# Altium integrated library WE-WPCC_rev16a.intlib: 38 symbols
Pins are listed as number, name and electrical type; pins without a type are passive.

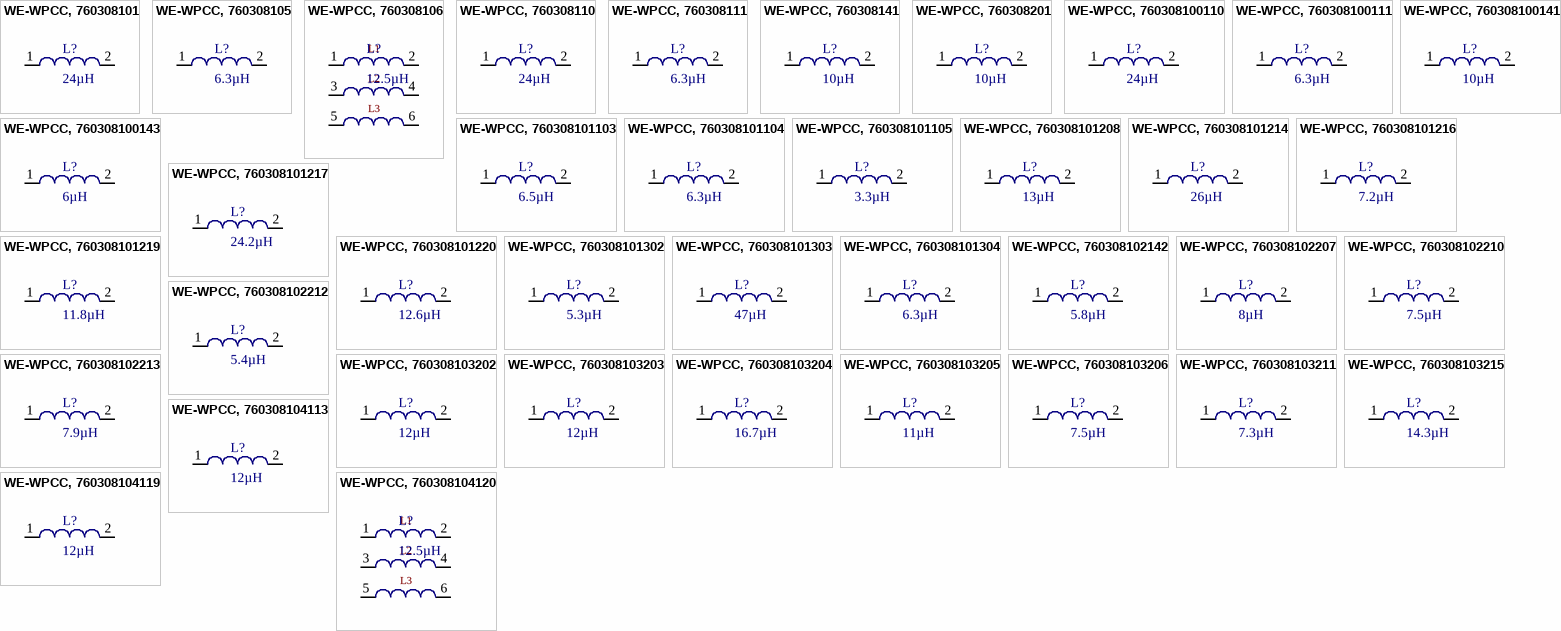
[diagram p0: symbols WE-WPCC, 760308101 to WE-WPCC, 760308104120]

## WE-WPCC, 760308101
designator L?, comment 24µH
WE-WPCC Wireless Power Charging Transmitter Coil, 4832, L= 24µH; partNo: 760308101; Manufacturer: Wurth Elektronik; Inductance: 24µH; ComponentLink1Description: Manufacturer; ComponentLink1URL: http://www.we-online.de; Created by: Baojun Chen; Created Date: Jan.2016; ComponentLink2Description: Datasheet; ComponentLink2URL: http://katalog.we-online.de/pbs/datasheet/760308101.pdf
footprint 760308101 (WE-WPCC Wireless Power Charging Receiver Coil, 5353)
pins: 1, 2

## WE-WPCC, 760308105
designator L?, comment 6.3µH
WE-WPCC Wireless Power Charging Transmitter Coil, 5353, L= 6.3µH; partNo: 760308105; Manufacturer: Wurth Elektronik; Inductance: 6.3µH; ComponentLink1Description: Manufacturer; ComponentLink1URL: http://www.we-online.de; Created by: Baojun Chen; Created Date: Jan.2016; ComponentLink2Description: Datasheet; ComponentLink2URL: http://katalog.we-online.de/pbs/datasheet/760308105.pdf
footprint 760308105 (WE-WPCC Wireless Power Charging Transmitter Coil, 5353)
pins: 1, 2

## WE-WPCC, 760308106
designator L?, comment 12.5µH
WE-WPCC Wireless Power Array, 13055, L= 12.5µH; partNo: 760308106; Manufacturer: Wurth Elektronik; Inductance: 12.5µH; ComponentLink1Description: Manufacturer; ComponentLink1URL: http://www.we-online.de; Created by: Baojun Chen; Created Date: Jan.2016; ComponentLink2Description: Datasheet; ComponentLink2URL: http://katalog.we-online.de/pbs/datasheet/760308106.pdf
footprint 760308106 (WE-WPCC Wireless Power Array, 13055)
pins: 1, 2, 3, 4, 5, 6
text: L1; L2; L3

## WE-WPCC, 760308110
designator L?, comment 24µH
WE-WPCC Wireless Power Charging Transmitter Coil, 5353, L= 24µH; partNo: 760308110; Manufacturer: Wurth Elektronik; Inductance: 24µH; ComponentLink1Description: Manufacturer; ComponentLink1URL: http://www.we-online.de; Created by: Baojun Chen; Created Date: Jan.2016; ComponentLink2Description: Datasheet; ComponentLink2URL: http://katalog.we-online.de/pbs/datasheet/760308110.pdf
footprint 760308110 (WE-WPCC Wireless Power Charging Transmitter Coil, 5353)
pins: 1, 2

## WE-WPCC, 760308111
designator L?, comment 6.3µH
WE-WPCC Wireless Power Charging Transmitter Coil, 5353, L= 6.3µH; partNo: 760308111; Manufacturer: Wurth Elektronik; Inductance: 6.3µH; ComponentLink1Description: Manufacturer; ComponentLink1URL: http://www.we-online.de; Created by: Baojun Chen; Created Date: Jan.2016; ComponentLink2Description: Datasheet; ComponentLink2URL: http://katalog.we-online.de/pbs/datasheet/760308111.pdf
footprint 760308111 (WE-WPCC Wireless Power Charging Transmitter Coil, 5353)
pins: 1, 2

## WE-WPCC, 760308141
designator L?, comment 10µH
WE-WPCC Wireless Power Charging Transmitter Coil, 5353, L= 10µH; partNo: 760308141; Manufacturer: Wurth Elektronik; Inductance: 10µH; ComponentLink1Description: Manufacturer; ComponentLink1URL: http://www.we-online.de; Created by: Baojun Chen; Created Date: Jan.2016; ComponentLink2Description: Datasheet; ComponentLink2URL: http://katalog.we-online.de/pbs/datasheet/760308141.pdf
footprint 760308141 (WE-WPCC Wireless Power Charging Transmitter Coil, 5353)
pins: 1, 2

## WE-WPCC, 760308201
designator L?, comment 10µH
WE-WPCC Wireless Power Charging Receiver Coil, 3737, L= 10µH; partNo: 760308201; Manufacturer: Wurth Elektronik; Inductance: 10µH; ComponentLink1Description: Manufacturer; ComponentLink1URL: http://www.we-online.de; Created by: Baojun Chen; Created Date: Jan.2016; ComponentLink2Description: Datasheet; ComponentLink2URL: http://katalog.we-online.de/pbs/datasheet/760308201.pdf
footprint 760308201 (WE-WPCC Wireless Power Charging Receiver Coil, 3737)
pins: 1, 2

## WE-WPCC, 760308100110
designator L?, comment 24µH
WE-WPCC Wireless Power Charging Transmitter Coil, L= 24µH; partNo: 760308100110; Manufacturer: Wurth Elektronik; Inductance: 24µH; ComponentLink1Description: Manufacturer; ComponentLink1URL: http://www.we-online.de; Created by: Baojun Chen; Created Date: Jan.2016; ComponentLink2Description: Datasheet; ComponentLink2URL: http://katalog.we-online.de/pbs/datasheet/760308100110.pdf
footprint 760308100110 (WE-WPCC Wireless Power Charging Transmitter Coil, ? 50)
pins: 1, 2

## WE-WPCC, 760308100111
designator L?, comment 6.3µH
WE-WPCC Wireless Power Charging Transmitter Coil, L= 6.3µH; partNo: 760308100111; Manufacturer: Wurth Elektronik; Inductance: 6.3µH; ComponentLink1Description: Manufacturer; ComponentLink1URL: http://www.we-online.de; Created by: Baojun Chen; Created Date: Jan.2016; ComponentLink2Description: Datasheet; ComponentLink2URL: http://katalog.we-online.de/pbs/datasheet/760308100111.pdf
footprint 760308100111 (WE-WPCC Wireless Power Charging Transmitter Coil, ? 50)
pins: 1, 2

## WE-WPCC, 760308100141
designator L?, comment 10µH
WE-WPCC Wireless Power Charging Transmitter Coil, L= 10µH; partNo: 760308100141; Manufacturer: Wurth Elektronik; Inductance: 10µH; ComponentLink1Description: Manufacturer; ComponentLink1URL: http://www.we-online.de; Created by: Baojun Chen; Created Date: Jan.2016; ComponentLink2Description: Datasheet; ComponentLink2URL: http://katalog.we-online.de/pbs/datasheet/760308100141.pdf
footprint 760308100141 (WE-WPCC Wireless Power Charging Transmitter Coil, ? 50)
pins: 1, 2

## WE-WPCC, 760308100143
designator L?, comment 6µH
WE-WPCC Wireless Power Charging Transmitter Coil, L= 6µH; partNo: 760308100143; Manufacturer: Wurth Elektronik; Inductance: 6µH; ComponentLink1Description: Manufacturer; ComponentLink1URL: http://www.we-online.de; Created by: Baojun Chen; Created Date: Jan.2016; ComponentLink2Description: Datasheet; ComponentLink2URL: http://katalog.we-online.de/pbs/datasheet/760308100143.pdf
footprint 760308100143 (WE-WPCC Wireless Power Charging Transmitter Coil, ? 50)
pins: 1, 2

## WE-WPCC, 760308101103
designator L?, comment 6.5µH
WE-WPCC Wireless Power Charging Transmitter Coil, L= 6.5µH; partNo: 760308101103; Manufacturer: Wurth Elektronik; Inductance: 6.5µH; ComponentLink1Description: Manufacturer; ComponentLink1URL: http://www.we-online.de; Created by: Baojun Chen; Created Date: Jan.2016; ComponentLink2Description: Datasheet; ComponentLink2URL: http://katalog.we-online.de/pbs/datasheet/760308101103.pdf
footprint 760308101103 (WE-WPCC Wireless Power Charging Transmitter Coil, ? 30)
pins: 1, 2

## WE-WPCC, 760308101104
designator L?, comment 6.3µH
WE-WPCC Wireless Power Charging Transmitter Coil, L= 6.3µH; partNo: 760308101104; Manufacturer: Wurth Elektronik; Inductance: 6.3µH; ComponentLink1Description: Manufacturer; ComponentLink1URL: http://www.we-online.de; Created by: Baojun Chen; Created Date: Jan.2016; ComponentLink2Description: Datasheet; ComponentLink2URL: http://katalog.we-online.de/pbs/datasheet/760308101104.pdf
footprint 760308101104 (WE-WPCC Wireless Power Charging Transmitter Coil, ? 20)
pins: 1, 2

## WE-WPCC, 760308101105
designator L?, comment 3.3µH
WE-WPCC Wireless Power Charging Transmitter Coil, L= 3.3µH; partNo: 760308101105; Manufacturer: Wurth Elektronik; Inductance: 3.3µH; ComponentLink1Description: Manufacturer; ComponentLink1URL: http://www.we-online.de; Created by: Baojun Chen; Created Date: Jan.2016; ComponentLink2Description: Datasheet; ComponentLink2URL: http://katalog.we-online.de/pbs/datasheet/760308101105.pdf
footprint 760308101105 (WE-WPCC Wireless Power Charging Transmitter Coil, ? 20)
pins: 1, 2

## WE-WPCC, 760308101208
designator L?, comment 13µH
WE-WPCC Wireless Power Charging Receiver Coil, L= 13µH; partNo: 760308101208; Manufacturer: Wurth Elektronik; Inductance: 13µH; ComponentLink1Description: Manufacturer; ComponentLink1URL: http://www.we-online.de; Created by: Baojun Chen; Created Date: Jan.2016; ComponentLink2Description: Datasheet; ComponentLink2URL: http://katalog.we-online.de/pbs/datasheet/760308101208.pdf
footprint 760308101208 (WE-WPCC Wireless Power Charging Receiver Coil, ? 10)
pins: 1, 2

## WE-WPCC, 760308101214
designator L?, comment 26µH
WE-WPCC Wireless Power Charging Receiver Coil, L= 26µH; partNo: 760308101214; Manufacturer: Wurth Elektronik; Inductance: 26µH; ComponentLink1Description: Manufacturer; ComponentLink1URL: http://www.we-online.de; Created by: Baojun Chen; Created Date: Jan.2016; ComponentLink2Description: Datasheet; ComponentLink2URL: http://katalog.we-online.de/pbs/datasheet/760308101214.pdf
footprint 760308101214 (WE-WPCC Wireless Power Charging Receiver Coil, ? 19)
pins: 1, 2

## WE-WPCC, 760308101216
designator L?, comment 7.2µH
WE-WPCC Wireless Power Charging Receiver Coil, L= 7.2µH; partNo: 760308101216; Manufacturer: Wurth Elektronik; Inductance: 7.2µH; ComponentLink1Description: Manufacturer; ComponentLink1URL: http://www.we-online.de; Created by: Baojun Chen; Created Date: Jan.2016; ComponentLink2Description: Datasheet; ComponentLink2URL: http://katalog.we-online.de/pbs/datasheet/760308101216.pdf
footprint 760308101216 (WE-WPCC Wireless Power Charging Receiver Coil, ? 6)
pins: 1, 2

## WE-WPCC, 760308101217
designator L?, comment 24.2µH
WE-WPCC Wireless Power Charging Receiver Coil, L= 24.2µH; partNo: 760308101217; Manufacturer: Wurth Elektronik; Inductance: 24.2µH; ComponentLink1Description: Manufacturer; ComponentLink1URL: http://www.we-online.de; Created by: Baojun Chen; Created Date: Jan.2016; ComponentLink2Description: Datasheet; ComponentLink2URL: http://katalog.we-online.de/pbs/datasheet/760308101217.pdf
footprint 760308101217 (WE-WPCC Wireless Power Charging Receiver Coil, ? 10)
pins: 1, 2

## WE-WPCC, 760308101219
designator L?, comment 11.8µH
WE-WPCC Wireless Power Charging Receiver Coil, L= 11.8µH; partNo: 760308101219; Manufacturer: Wurth Elektronik; Inductance: 11.8µH; ComponentLink1Description: Manufacturer; ComponentLink1URL: http://www.we-online.de; Created by: Baojun Chen; Created Date: Jan.2016; ComponentLink2Description: Datasheet; ComponentLink2URL: http://katalog.we-online.de/pbs/datasheet/760308101219.pdf
footprint 760308101219 (WE-WPCC Wireless Power Charging Receiver Coil, ? 15)
pins: 1, 2

## WE-WPCC, 760308101220
designator L?, comment 12.6µH
WE-WPCC Wireless Power Charging Receiver Coil, L= 12.6µH; partNo: 760308101220; Manufacturer: Wurth Elektronik; Inductance: 12.6µH; ComponentLink1Description: Manufacturer; ComponentLink1URL: http://www.we-online.de; Created by: Baojun Chen; Created Date: Jan.2016; ComponentLink2Description: Datasheet; ComponentLink2URL: http://katalog.we-online.de/pbs/datasheet/760308101220.pdf
footprint 760308101220 (WE-WPCC Wireless Power Charging Receiver Coil, ? 17)
pins: 1, 2

## WE-WPCC, 760308101302
designator L?, comment 5.3µH
WE-WPCC Wireless Power Charging Transmitter Coil, L= 5.3µH; partNo: 760308101302; Manufacturer: Wurth Elektronik; Inductance: 5.3µH; ComponentLink1Description: Manufacturer; ComponentLink1URL: http://www.we-online.de; Created by: Baojun Chen; Created Date: Jan.2016; ComponentLink2Description: Datasheet; ComponentLink2URL: http://katalog.we-online.de/pbs/datasheet/760308101302.pdf
footprint 760308101302 (WE-WPCC Wireless Power Charging Transmitter Coil, ? 50)
pins: 1, 2

## WE-WPCC, 760308101303
designator L?, comment 47µH
WE-WPCC Wireless Power Charging Receiver Coil, L= 47µH; partNo: 760308101303; Manufacturer: Wurth Elektronik; Inductance: 47µH; ComponentLink1Description: Manufacturer; ComponentLink1URL: http://www.we-online.de; Created by: Baojun Chen; Created Date: Jan.2016; ComponentLink2Description: Datasheet; ComponentLink2URL: http://katalog.we-online.de/pbs/datasheet/760308101303.pdf
footprint 760308101303 (WE-WPCC Wireless Power Charging Receiver Coil, ? 26)
pins: 1, 2

## WE-WPCC, 760308101304
designator L?, comment 6.3µH
WE-WPCC Wireless Power Charging Transmitter Coil, L= 6.3µH; partNo: 760308101304; Manufacturer: Wurth Elektronik; Inductance: 6.3µH; ComponentLink1Description: Manufacturer; ComponentLink1URL: http://www.we-online.de; Created by: Baojun Chen; Created Date: Jan.2016; ComponentLink2Description: Datasheet; ComponentLink2URL: http://katalog.we-online.de/pbs/datasheet/760308101304.pdf
footprint 760308101304 (WE-WPCC Wireless Power Charging Transmitter Coil, ? 48)
pins: 1, 2

## WE-WPCC, 760308102142
designator L?, comment 5.8µH
WE-WPCC Wireless Power Charging Transmitter Coil, 5353, L= 5.8µH; partNo: 760308102142; Manufacturer: Wurth Elektronik; Inductance: 5.8µH; ComponentLink1Description: Manufacturer; ComponentLink1URL: http://www.we-online.de; Created by: Baojun Chen; Created Date: Jan.2016; ComponentLink2Description: Datasheet; ComponentLink2URL: http://katalog.we-online.de/pbs/datasheet/760308102142.pdf
footprint 760308102142 (WE-WPCC Wireless Power Charging Transmitter Coil, 5353)
pins: 1, 2

## WE-WPCC, 760308102207
designator L?, comment 8µH
WE-WPCC Wireless Power Charging Receiver Coil, 4040, L= 8µH; partNo: 760308102207; Manufacturer: Wurth Elektronik; Inductance: 8µH; ComponentLink1Description: Manufacturer; ComponentLink1URL: http://www.we-online.de; Created by: Baojun Chen; Created Date: Jan.2016; ComponentLink2Description: Datasheet; ComponentLink2URL: http://katalog.we-online.de/pbs/datasheet/760308102207.pdf
footprint 760308102207 (WE-WPCC Wireless Power Charging Receiver Coil, 4040)
pins: 1, 2

## WE-WPCC, 760308102210
designator L?, comment 7.5µH
WE-WPCC Wireless Power Charging Receiver Coil, 2929, L= 7.5µH; partNo: 760308102210; Manufacturer: Wurth Elektronik; Inductance: 7.5µH; ComponentLink1Description: Manufacturer; ComponentLink1URL: http://www.we-online.de; Created by: Baojun Chen; Created Date: Jan.2016; ComponentLink2Description: Datasheet; ComponentLink2URL: http://katalog.we-online.de/pbs/datasheet/760308102210.pdf
footprint 760308102210 (WE-WPCC Wireless Power Charging Receiver Coil, 3737)
pins: 1, 2

## WE-WPCC, 760308102212
designator L?, comment 5.4µH
WE-WPCC Wireless Power Charging Receiver Coil, 2929, L= 5.4µH; partNo: 760308102212; Manufacturer: Wurth Elektronik; Inductance: 5.4µH; ComponentLink1Description: Manufacturer; ComponentLink1URL: http://www.we-online.de; Created by: Baojun Chen; Created Date: Jan.2016; ComponentLink2Description: Datasheet; ComponentLink2URL: http://katalog.we-online.de/pbs/datasheet/760308102212.pdf
footprint 760308102212 (WE-WPCC Wireless Power Charging Receiver Coil, 2929)
pins: 1, 2

## WE-WPCC, 760308102213
designator L?, comment 7.9µH
WE-WPCC Wireless Power Charging Receiver Coil, 2929, L= 7.9µH; partNo: 760308102213; Manufacturer: Wurth Elektronik; Inductance: 7.9µH; ComponentLink1Description: Manufacturer; ComponentLink1URL: http://www.we-online.de; Created by: Baojun Chen; Created Date: Jan.2016; ComponentLink2Description: Datasheet; ComponentLink2URL: http://katalog.we-online.de/pbs/datasheet/760308102213.pdf
footprint 760308102213 (WE-WPCC Wireless Power Charging Receiver Coil, 2929)
pins: 1, 2

## WE-WPCC, 760308103202
designator L?, comment 12µH
WE-WPCC Wireless Power Charging Receiver Coil, 4832, L= 12µH; partNo: 760308103202; Manufacturer: Wurth Elektronik; Inductance: 12µH; ComponentLink1Description: Manufacturer; ComponentLink1URL: http://www.we-online.de; Created by: Baojun Chen; Created Date: Jan.2016; ComponentLink2Description: Datasheet; ComponentLink2URL: http://katalog.we-online.de/pbs/datasheet/760308103202.pdf
footprint 760308103202 (WE-WPCC Wireless Power Charging Receiver Coil, 4832)
pins: 1, 2

## WE-WPCC, 760308103203
designator L?, comment 12µH
WE-WPCC Wireless Power Charging Receiver Coil, 4832, L= 12µH; partNo: 760308103203; Manufacturer: Wurth Elektronik; Inductance: 12µH; ComponentLink1Description: Manufacturer; ComponentLink1URL: http://www.we-online.de; Created by: Baojun Chen; Created Date: Jan.2016; ComponentLink2Description: Datasheet; ComponentLink2URL: http://katalog.we-online.de/pbs/datasheet/760308103203.pdf
footprint 760308103203 (WE-WPCC Wireless Power Charging Receiver Coil, 4832)
pins: 1, 2

## WE-WPCC, 760308103204
designator L?, comment 16.7µH
WE-WPCC Wireless Power Charging Receiver Coil, 3830, L= 16.7µH; partNo: 760308103204; Manufacturer: Wurth Elektronik; Inductance: 16.7µH; ComponentLink1Description: Manufacturer; ComponentLink1URL: http://www.we-online.de; Created by: Baojun Chen; Created Date: Jan.2016; ComponentLink2Description: Datasheet; ComponentLink2URL: http://katalog.we-online.de/pbs/datasheet/760308103204.pdf
footprint 760308103204 (WE-WPCC Wireless Power Charging Receiver Coil, 3830)
pins: 1, 2

## WE-WPCC, 760308103205
designator L?, comment 11µH
WE-WPCC Wireless Power Charging Receiver Coil, 3426, L= 11µH; partNo: 760308103205; Manufacturer: Wurth Elektronik; Inductance: 11µH; ComponentLink1Description: Manufacturer; ComponentLink1URL: http://www.we-online.de; Created by: Baojun Chen; Created Date: Jan.2016; ComponentLink2Description: Datasheet; ComponentLink2URL: http://katalog.we-online.de/pbs/datasheet/760308103205.pdf
footprint 760308103205 (WE-WPCC Wireless Power Charging Receiver Coil, 3426)
pins: 1, 2

## WE-WPCC, 760308103206
designator L?, comment 7.5µH
WE-WPCC Wireless Power Charging Receiver Coil, 2815, L= 7.5µH; partNo: 760308103206; Manufacturer: Wurth Elektronik; Inductance: 7.5µH; ComponentLink1Description: Manufacturer; ComponentLink1URL: http://www.we-online.de; Created by: Baojun Chen; Created Date: Jan.2016; ComponentLink2Description: Datasheet; ComponentLink2URL: http://katalog.we-online.de/pbs/datasheet/760308103206.pdf
footprint 760308103206 (WE-WPCC Wireless Power Charging Receiver Coil, 2815)
pins: 1, 2

## WE-WPCC, 760308103211
designator L?, comment 7.3µH
WE-WPCC Wireless Power Charging Receiver Coil, 4636, L= 7.3µH; partNo: 760308103211; Manufacturer: Wurth Elektronik; Inductance: 7.3µH; ComponentLink1Description: Manufacturer; ComponentLink1URL: http://www.we-online.de; Created by: Baojun Chen; Created Date: Jan.2016; ComponentLink2Description: Datasheet; ComponentLink2URL: http://katalog.we-online.de/pbs/datasheet/760308103211.pdf
footprint 760308103211 (WE-WPCC Wireless Power Charging Receiver Coil, 4636)
pins: 1, 2

## WE-WPCC, 760308103215
designator L?, comment 14.3µH
WE-WPCC Wireless Power Charging Receiver Coil, 4832, L= 14.3µH; partNo: 760308103215; Manufacturer: Wurth Elektronik; Inductance: 14.3µH; ComponentLink1Description: Manufacturer; ComponentLink1URL: http://www.we-online.de; Created by: Baojun Chen; Created Date: Jan.2016; ComponentLink2Description: Datasheet; ComponentLink2URL: http://katalog.we-online.de/pbs/datasheet/760308103215.pdf
footprint 760308103215 (WE-WPCC Wireless Power Charging Receiver Coil, 4832)
pins: 1, 2

## WE-WPCC, 760308104113
designator L?, comment 12µH
WE-WPCC Wireless Power Charging Transmitter Coil, 6052, L= 12µH; partNo: 760308104113; Manufacturer: Wurth Elektronik; Inductance: 12µH; ComponentLink1Description: Manufacturer; ComponentLink1URL: http://www.we-online.de; Created by: Baojun Chen; Created Date: Jan.2016; ComponentLink2Description: Datasheet; ComponentLink2URL: http://katalog.we-online.de/pbs/datasheet/760308104113.pdf
footprint 760308104113 (WE-WPCC Wireless Power Charging Transmitter Coil, 6052)
pins: 1, 2

## WE-WPCC, 760308104119
designator L?, comment 12µH
WE-WPCC Wireless Power Array, 8852, L= 12µH; partNo: 760308104119; Manufacturer: Wurth Elektronik; Inductance: 12µH; ComponentLink1Description: Manufacturer; ComponentLink1URL: http://www.we-online.de; Created by: Baojun Chen; Created Date: Jan.2016; ComponentLink2Description: Datasheet; ComponentLink2URL: http://katalog.we-online.de/pbs/datasheet/760308104119.pdf
footprint 760308104119 (WE-WPCC Wireless Power Array, 8852)
pins: 1, 2

## WE-WPCC, 760308104120
designator L?, comment 12.5µH
WE-WPCC Wireless Power Array, 9250, L= 6.9µH; partNo: 760308104120; Manufacturer: Wurth Elektronik; Inductance: 12.5µH; ComponentLink1Description: Manufacturer; ComponentLink1URL: http://www.we-online.de; Created by: Baojun Chen; Created Date: Jan.2016; ComponentLink2Description: Datasheet; ComponentLink2URL: http://katalog.we-online.de/pbs/datasheet/760308104120.pdf
footprint 760308104120 (WE-WPCC Wireless Power Array, 9250)
pins: 1, 2, 3, 4, 5, 6
text: L1; L2; L3